# Altium footprint library Miscellaneous THD.PcbLib: 216 footprints (part 5 of 15) (continued)
## HFBR-2602Z [mm] "HFBR-2602Z Series, Fiber Optic Receiver, Through Hole Mount"
height 10.2
pads (8):
  round 1.7 hole 1: 1(-1.27,3.81) 4(-1.27,-3.81) 5(1.27,-3.81) 8(1.27,3.81)
  round 1.4 hole 0.7: 2(-1.27,1.27) 3(-1.27,-1.27) 6(1.27,-1.27) 7(1.27,1.27)
Top Overlay:
  circle w0.3: c-3.81,5.08 r0.15
  lines w0.2: 7.62,-3.2 8.12,-3.2 8.12,3.2 7.62,3.2 ; 8.12,2.7 8.62,3.2 ; 8.62,-3.2 9.12,-2.7 ; 8.62,-3.2 8.12,-2.7 8.62,3.2 ; 8.62,-3.2 9.12,2.7 ; 8.62,3.2 9.12,2.7 ; 9.12,-2.7 9.62,-3.2 ; 9.12,-2.7 9.62,3.2 ; 9.12,2.7 9.62,3.2 ; 9.62,-3.2 10.12,-2.7 ; 9.62,-3.2 10.12,2.7 ; 9.62,3.2 10.12,2.7 ; 10.12,-2.7 10.62,-3.2 ; 10.12,-2.7 10.62,3.2 ; 10.12,2.7 10.62,3.2 ; 10.62,-3.2 11.12,-2.7 ; 10.62,-3.2 11.12,2.7 ; 10.62,3.2 11.12,2.7 ; 11.12,-2.7 11.62,-3.2 ; 11.12,-2.7 11.62,3.2 ; 11.12,2.7 11.62,3.2 ; 11.62,-3.2 12.12,-2.7 ; 11.62,-3.2 12.12,2.7 ; 11.62,3.2 12.12,2.7 ; 12.12,-2.7 12.62,-3.2 ; 12.12,-2.7 12.62,3.2 ; 12.12,2.7 12.62,3.2 ; 12.62,-3.2 13.12,-2.7 ; 12.62,-3.2 13.12,2.7 ; 12.62,3.2 13.12,2.7 ; 13.12,-2.7 13.62,-3.2 ; 13.12,-2.7 13.62,3.2 ; 13.12,2.7 13.62,3.2 ; 13.62,-3.2 14.12,-2.7 ; 13.62,-3.2 14.12,2.7 ; 13.62,3.2 14.12,2.7 ; 14.12,-2.7 14.62,-3.2 ; 14.12,-2.7 14.62,3.2 ; 14.12,2.7 14.62,3.2 ; 14.62,-3.2 15.12,-2.7 ; 14.62,-3.2 15.12,2.7 ; 14.62,3.2 15.12,2.7 ; 15.12,-2.7 15.62,-3.2 ; 15.12,-2.7 15.62,3.2 ; 15.12,2.7 15.62,3.2 ; 15.62,-3.2 16.12,-2.7 ; 15.62,-3.2 16.12,2.7 ; 15.62,3.2 16.12,2.7 ; 16.12,-2.7 16.62,-3.2 ; 16.12,-2.7 16.62,3.2 ; 16.12,2.7 16.62,3.2 ; 16.62,-3.2 17.12,-2.7 17.12,2.7 ; 16.62,-3.2 17.12,2.7 ; 16.62,3.2 17.12,2.7 ; -5.08,-6.15 ccw(c-4.88,-6.15) -4.88,-6.35 7.42,-6.35 ccw(c7.42,-6.15) 7.62,-6.15 7.62,6.15 ccw(c7.42,6.15) 7.42,6.35 -4.88,6.35 ccw(c-4.88,6.15) -5.08,6.15 -5.08,-6.15
Mechanical 8:
  lines w0.1: -2.27,-3.81 -1.27,-3.81 ; -2.27,-1.27 -1.27,-1.27 ; -2.27,1.27 -1.27,1.27 ; -2.27,3.81 -1.27,3.81 ; -1.27,-4.81 -1.27,-3.81 ; -1.27,-2.81 -1.27,-3.81 ; -1.27,-2.27 -1.27,-1.27 ; -1.27,-0.27 -1.27,-1.27 ; -1.27,0.27 -1.27,1.27 ; -1.27,2.27 -1.27,1.27 ; -1.27,2.81 -1.27,3.81 ; -1.27,4.81 -1.27,3.81 ; -1,0 0,0 ; -0.27,-3.81 -1.27,-3.81 ; -0.27,-1.27 -1.27,-1.27 ; -0.27,1.27 -1.27,1.27 ; -0.27,3.81 -1.27,3.81 ; 0,-1 0,0 ; 0,1 0,0 ; 0.27,-3.81 1.27,-3.81 ; 0.27,-1.27 1.27,-1.27 ; 0.27,1.27 1.27,1.27 ; 0.27,3.81 1.27,3.81 ; 1,0 0,0 ; 1.27,-4.81 1.27,-3.81 ; 1.27,-2.81 1.27,-3.81 ; 1.27,-2.27 1.27,-1.27 ; 1.27,-0.27 1.27,-1.27 ; 1.27,0.27 1.27,1.27 ; 1.27,2.27 1.27,1.27 ; 1.27,2.81 1.27,3.81 ; 1.27,4.81 1.27,3.81 ; 2.27,-3.81 1.27,-3.81 ; 2.27,-1.27 1.27,-1.27 ; 2.27,1.27 1.27,1.27 ; 2.27,3.81 1.27,3.81
Mechanical 14:
  circle w0.3: c-3.81,5.08 r0.15
  lines w0.1: 7.62,-3.2 8.12,-3.2 8.12,3.2 7.62,3.2 ; 8.12,2.7 8.62,3.2 ; 8.62,-3.2 9.12,-2.7 ; 8.62,-3.2 8.12,-2.7 8.62,3.2 ; 8.62,-3.2 9.12,2.7 ; 8.62,3.2 9.12,2.7 ; 9.12,-2.7 9.62,-3.2 ; 9.12,-2.7 9.62,3.2 ; 9.12,2.7 9.62,3.2 ; 9.62,-3.2 10.12,-2.7 ; 9.62,-3.2 10.12,2.7 ; 9.62,3.2 10.12,2.7 ; 10.12,-2.7 10.62,-3.2 ; 10.12,-2.7 10.62,3.2 ; 10.12,2.7 10.62,3.2 ; 10.62,-3.2 11.12,-2.7 ; 10.62,-3.2 11.12,2.7 ; 10.62,3.2 11.12,2.7 ; 11.12,-2.7 11.62,-3.2 ; 11.12,-2.7 11.62,3.2 ; 11.12,2.7 11.62,3.2 ; 11.62,-3.2 12.12,-2.7 ; 11.62,-3.2 12.12,2.7 ; 11.62,3.2 12.12,2.7 ; 12.12,-2.7 12.62,-3.2 ; 12.12,-2.7 12.62,3.2 ; 12.12,2.7 12.62,3.2 ; 12.62,-3.2 13.12,-2.7 ; 12.62,-3.2 13.12,2.7 ; 12.62,3.2 13.12,2.7 ; 13.12,-2.7 13.62,-3.2 ; 13.12,-2.7 13.62,3.2 ; 13.12,2.7 13.62,3.2 ; 13.62,-3.2 14.12,-2.7 ; 13.62,-3.2 14.12,2.7 ; 13.62,3.2 14.12,2.7 ; 14.12,-2.7 14.62,-3.2 ; 14.12,-2.7 14.62,3.2 ; 14.12,2.7 14.62,3.2 ; 14.62,-3.2 15.12,-2.7 ; 14.62,-3.2 15.12,2.7 ; 14.62,3.2 15.12,2.7 ; 15.12,-2.7 15.62,-3.2 ; 15.12,-2.7 15.62,3.2 ; 15.12,2.7 15.62,3.2 ; 15.62,-3.2 16.12,-2.7 ; 15.62,-3.2 16.12,2.7 ; 15.62,3.2 16.12,2.7 ; 16.12,-2.7 16.62,-3.2 ; 16.12,-2.7 16.62,3.2 ; 16.12,2.7 16.62,3.2 ; 16.62,-3.2 17.12,-2.7 17.12,2.7 ; 16.62,-3.2 17.12,2.7 ; 16.62,3.2 17.12,2.7 ; -5.08,-6.15 ccw(c-4.88,-6.15) -4.88,-6.35 7.42,-6.35 ccw(c7.42,-6.15) 7.62,-6.15 7.62,6.15 ccw(c7.42,6.15) 7.42,6.35 -4.88,6.35 ccw(c-4.88,6.15) -5.08,6.15 -5.08,-6.15
3D body "HFBR-2602Z.stp": height 10.2, standoff -3.6, extent -5.08,-6.348 17.62,6.348

## HFBR-5911LZ [mm] "Small Form Factor (SFF) Optical Transceiver for Gigabit Ethernet (1.25 GBd) and iSCSI"
height 9.8
pads (18):
  round 1.5 hole 0.8: 1(10.68,5.08) 2(8.9,5.08) 3(7.12,5.08) 4(5.34,5.08) 5(3.56,5.08) 6(3.56,-5.08) 7(5.34,-5.08) 8(7.12,-5.08) 9(8.9,-5.08) 10(10.68,-5.08)
  round 2.1 hole 1.4: CAGE(0,-5.08) CAGE(0,5.08) CAGE(21.36,-6.67) CAGE(23.9,6.67)
  rect 1.8x1 smd paste-0.8: CAGE(1.82,-6.67) CAGE(1.82,6.67)
  round 2.3 hole 1.4: CAGE(28.47,-5.08) CAGE(28.47,5.08)
Top Layer:
  region: 25.47,6.795 25.47,3.795 31.47,3.795 31.47,6.795
  region: 25.47,-3.795 25.47,-6.795 31.47,-6.795 31.47,-3.795
Top Overlay:
  lines w0.2: -0.125,-6.525 -0.125,-6.795 0.52,-6.795 ; -0.125,-3.635 -0.125,3.635 ; -0.125,6.525 -0.125,6.795 0.52,6.795 ; 3.12,-6.795 19.915,-6.795 ; 3.12,6.795 22.455,6.795 ; 22.805,-6.795 25.07,-6.795 ; 31.87,-6.795 48.06,-6.795 48.06,6.795 31.87,6.795 ; 35.675,6.736 35.714,-6.795 ; 36.475,-6.795 36.475,6.795 ; 43.459,-5.7 41.296,-5.7 41.296,-4.7 43.459,-4.7 ; 43.459,-0.5 41.296,-0.5 41.296,0.5 43.459,0.5 ; 43.459,4.7 41.296,4.7 41.296,5.7 43.459,5.7 ; 43.63,-6.795 cw(c42.23,-1.995) 40.83,-6.795 40.774,-6.987 ccw(c42.23,-1.995) 44.23,-6.795 ; 43.63,6.795 ccw(c42.23,1.995) 40.83,6.795 40.774,6.987 cw(c42.23,1.995) 44.23,6.795 ; 45.56,-4.75 48.06,-4.75 ; 45.568,-6.795 45.568,6.795 ; 45.573,-1.35 48.06,-1.35 ; 45.573,1.35 48.06,1.35 ; 45.573,4.75 48.06,4.75 ; 45.925,-4.75 45.925,-5.35 48.06,-5.35 ; 45.925,-1.35 45.925,-0.75 48.06,-0.75 ; 45.925,1.35 45.925,0.75 48.06,0.75 ; 45.925,4.75 45.925,5.35 48.06,5.35 ; 42.377,-2.9 42.377,-2.3 44.377,-2.3 44.377,-2 45.177,-2.6 44.377,-3.2 44.377,-2.9 42.377,-2.9 ; 42.377,2.6 43.177,3.2 43.177,2.9 45.177,2.9 45.177,2.3 43.177,2.3 43.177,2 42.377,2.6
Mechanical 8:
  drawing of 165 lines, arcs and shapes, not listed
Mechanical 14:
  lines w0.1: 35.675,6.736 35.714,-6.795 ; 36.475,-6.795 36.475,6.795 ; 43.459,-5.7 41.296,-5.7 41.296,-4.7 43.459,-4.7 ; 43.459,-0.5 41.296,-0.5 41.296,0.5 43.459,0.5 ; 43.459,4.7 41.296,4.7 41.296,5.7 43.459,5.7 ; 43.63,-6.795 cw(c42.23,-1.995) 40.83,-6.795 40.774,-6.987 ccw(c42.23,-1.995) 44.23,-6.795 ; 43.63,6.795 ccw(c42.23,1.995) 40.83,6.795 40.774,6.987 cw(c42.23,1.995) 44.23,6.795 ; 45.56,-4.75 48.06,-4.75 ; 45.568,-6.795 45.568,6.795 ; 45.573,-1.35 48.06,-1.35 ; 45.573,1.35 48.06,1.35 ; 45.573,4.75 48.06,4.75 ; 45.925,-4.75 45.925,-5.35 48.06,-5.35 ; 45.925,-1.35 45.925,-0.75 48.06,-0.75 ; 45.925,1.35 45.925,0.75 48.06,0.75 ; 45.925,4.75 45.925,5.35 48.06,5.35 ; -0.125,-6.795 -0.125,6.795 48.06,6.795 48.06,-6.795 -0.125,-6.795 ; 42.377,-2.9 42.377,-2.3 44.377,-2.3 44.377,-2 45.177,-2.6 44.377,-3.2 44.377,-2.9 42.377,-2.9 ; 42.377,2.6 43.177,3.2 43.177,2.9 45.177,2.9 45.177,2.3 43.177,2.3 43.177,2 42.377,2.6
3D body "HFBR-5911LZ.stp": height 10.09, standoff -3.2, extent -0.125,-7.187 48.06,7.187

## HFBR-x40x [mm] "HFBR-0400Z Series, Fiber Optic Transmitter or Receiver, Through Hole Mount"
height 10.2
pads (8):
  round 1.7 hole 1: 1(-1.27,3.81) 4(-1.27,-3.81) 5(1.27,-3.81) 8(1.27,3.81)
  round 1.4 hole 0.7: 2(-1.27,1.27) 3(-1.27,-1.27) 6(1.27,-1.27) 7(1.27,1.27)
Top Overlay:
  circle w0.3: c-3.81,5.08 r0.15
  lines w0.2: 7.62,-3.2 8.12,-3.2 8.12,3.2 7.62,3.2 ; 8.12,2.7 8.62,3.2 ; 8.62,-3.2 9.12,-2.7 ; 8.62,-3.2 8.12,-2.7 8.62,3.2 ; 8.62,-3.2 9.12,2.7 ; 8.62,3.2 9.12,2.7 ; 9.12,-2.7 9.62,-3.2 ; 9.12,-2.7 9.62,3.2 ; 9.12,2.7 9.62,3.2 ; 9.62,-3.2 10.12,-2.7 ; 9.62,-3.2 10.12,2.7 ; 9.62,3.2 10.12,2.7 ; 10.12,-2.7 10.62,-3.2 ; 10.12,-2.7 10.62,3.2 ; 10.12,2.7 10.62,3.2 ; 10.62,-3.2 11.12,-2.7 ; 10.62,-3.2 11.12,2.7 ; 10.62,3.2 11.12,2.7 ; 11.12,-2.7 11.62,-3.2 ; 11.12,-2.7 11.62,3.2 ; 11.12,2.7 11.62,3.2 ; 11.62,-3.2 12.12,-2.7 ; 11.62,-3.2 12.12,2.7 ; 11.62,3.2 12.12,2.7 ; 12.12,-2.7 12.62,-3.2 ; 12.12,-2.7 12.62,3.2 ; 12.12,2.7 12.62,3.2 ; 12.62,-3.2 13.12,-2.7 ; 12.62,-3.2 13.12,2.7 ; 12.62,3.2 13.12,2.7 ; 13.12,-2.7 13.62,-3.2 ; 13.12,-2.7 13.62,3.2 ; 13.12,2.7 13.62,3.2 ; 13.62,-3.2 14.12,-2.7 ; 13.62,-3.2 14.12,2.7 ; 13.62,3.2 14.12,2.7 ; 14.12,-2.7 14.62,-3.2 ; 14.12,-2.7 14.62,3.2 ; 14.12,2.7 14.62,3.2 ; 14.62,-3.2 15.12,-2.7 ; 14.62,-3.2 15.12,2.7 ; 14.62,3.2 15.12,2.7 ; 15.12,-2.7 15.62,-3.2 ; 15.12,-2.7 15.62,3.2 ; 15.12,2.7 15.62,3.2 ; 15.62,-3.2 16.12,-2.7 ; 15.62,-3.2 16.12,2.7 ; 15.62,3.2 16.12,2.7 ; 16.12,-2.7 16.62,-3.2 ; 16.12,-2.7 16.62,3.2 ; 16.12,2.7 16.62,3.2 ; 16.62,-3.2 17.12,-2.7 17.12,2.7 ; 16.62,-3.2 17.12,2.7 ; 16.62,3.2 17.12,2.7 ; -5.08,-6.15 ccw(c-4.88,-6.15) -4.88,-6.35 7.42,-6.35 ccw(c7.42,-6.15) 7.62,-6.15 7.62,6.15 ccw(c7.42,6.15) 7.42,6.35 -4.88,6.35 ccw(c-4.88,6.15) -5.08,6.15 -5.08,-6.15
Mechanical 8:
  lines w0.1: -2.27,-3.81 -1.27,-3.81 ; -2.27,-1.27 -1.27,-1.27 ; -2.27,1.27 -1.27,1.27 ; -2.27,3.81 -1.27,3.81 ; -1.27,-4.81 -1.27,-3.81 ; -1.27,-2.81 -1.27,-3.81 ; -1.27,-2.27 -1.27,-1.27 ; -1.27,-0.27 -1.27,-1.27 ; -1.27,0.27 -1.27,1.27 ; -1.27,2.27 -1.27,1.27 ; -1.27,2.81 -1.27,3.81 ; -1.27,4.81 -1.27,3.81 ; -1,0 0,0 ; -0.27,-3.81 -1.27,-3.81 ; -0.27,-1.27 -1.27,-1.27 ; -0.27,1.27 -1.27,1.27 ; -0.27,3.81 -1.27,3.81 ; 0,-1 0,0 ; 0,1 0,0 ; 0.27,-3.81 1.27,-3.81 ; 0.27,-1.27 1.27,-1.27 ; 0.27,1.27 1.27,1.27 ; 0.27,3.81 1.27,3.81 ; 1,0 0,0 ; 1.27,-4.81 1.27,-3.81 ; 1.27,-2.81 1.27,-3.81 ; 1.27,-2.27 1.27,-1.27 ; 1.27,-0.27 1.27,-1.27 ; 1.27,0.27 1.27,1.27 ; 1.27,2.27 1.27,1.27 ; 1.27,2.81 1.27,3.81 ; 1.27,4.81 1.27,3.81 ; 2.27,-3.81 1.27,-3.81 ; 2.27,-1.27 1.27,-1.27 ; 2.27,1.27 1.27,1.27 ; 2.27,3.81 1.27,3.81
Mechanical 14:
  circle w0.3: c-3.81,5.08 r0.15
  lines w0.1: 7.62,-3.2 8.12,-3.2 8.12,3.2 7.62,3.2 ; 8.12,2.7 8.62,3.2 ; 8.62,-3.2 9.12,-2.7 ; 8.62,-3.2 8.12,-2.7 8.62,3.2 ; 8.62,-3.2 9.12,2.7 ; 8.62,3.2 9.12,2.7 ; 9.12,-2.7 9.62,-3.2 ; 9.12,-2.7 9.62,3.2 ; 9.12,2.7 9.62,3.2 ; 9.62,-3.2 10.12,-2.7 ; 9.62,-3.2 10.12,2.7 ; 9.62,3.2 10.12,2.7 ; 10.12,-2.7 10.62,-3.2 ; 10.12,-2.7 10.62,3.2 ; 10.12,2.7 10.62,3.2 ; 10.62,-3.2 11.12,-2.7 ; 10.62,-3.2 11.12,2.7 ; 10.62,3.2 11.12,2.7 ; 11.12,-2.7 11.62,-3.2 ; 11.12,-2.7 11.62,3.2 ; 11.12,2.7 11.62,3.2 ; 11.62,-3.2 12.12,-2.7 ; 11.62,-3.2 12.12,2.7 ; 11.62,3.2 12.12,2.7 ; 12.12,-2.7 12.62,-3.2 ; 12.12,-2.7 12.62,3.2 ; 12.12,2.7 12.62,3.2 ; 12.62,-3.2 13.12,-2.7 ; 12.62,-3.2 13.12,2.7 ; 12.62,3.2 13.12,2.7 ; 13.12,-2.7 13.62,-3.2 ; 13.12,-2.7 13.62,3.2 ; 13.12,2.7 13.62,3.2 ; 13.62,-3.2 14.12,-2.7 ; 13.62,-3.2 14.12,2.7 ; 13.62,3.2 14.12,2.7 ; 14.12,-2.7 14.62,-3.2 ; 14.12,-2.7 14.62,3.2 ; 14.12,2.7 14.62,3.2 ; 14.62,-3.2 15.12,-2.7 ; 14.62,-3.2 15.12,2.7 ; 14.62,3.2 15.12,2.7 ; 15.12,-2.7 15.62,-3.2 ; 15.12,-2.7 15.62,3.2 ; 15.12,2.7 15.62,3.2 ; 15.62,-3.2 16.12,-2.7 ; 15.62,-3.2 16.12,2.7 ; 15.62,3.2 16.12,2.7 ; 16.12,-2.7 16.62,-3.2 ; 16.12,-2.7 16.62,3.2 ; 16.12,2.7 16.62,3.2 ; 16.62,-3.2 17.12,-2.7 17.12,2.7 ; 16.62,-3.2 17.12,2.7 ; 16.62,3.2 17.12,2.7 ; -5.08,-6.15 ccw(c-4.88,-6.15) -4.88,-6.35 7.42,-6.35 ccw(c7.42,-6.15) 7.62,-6.15 7.62,6.15 ccw(c7.42,6.15) 7.42,6.35 -4.88,6.35 ccw(c-4.88,6.15) -5.08,6.15 -5.08,-6.15
3D body "HFBR-x40x.stp": height 10.2, standoff -3.6, extent -5.08,-6.35 17.62,6.35

## HFBR-x41xTMZ [mm] "HFBR-14xxZ, HFBR-14xxZ Series With Threaded ST Port (Metal Option), Fiber Optic Transmitter or Receiver, Through Hole Mount"
height 10.2
pads (8):
  round 1.6 hole 0.9: 1(-1.27,3.81) 4(-1.27,-3.81) 5(1.27,-3.81) 8(1.27,3.81)
  round 1.4 hole 0.7: 2(-1.27,1.27) 3(-1.27,-1.27) 6(1.27,-1.27) 7(1.27,1.27)
Top Overlay:
  circle w0.3: c-3.81,5.08 r0.15
  lines w0.2: 7.62,3.525 22.12,3.525 22.12,-3.525 7.625,-3.525 ; 16.92,-3.525 16.92,-4.2 18.32,-4.2 18.32,-3.525 ; 16.92,3.525 16.92,4.2 18.32,4.2 18.32,3.525 ; 22.12,-0.6 15.92,-0.6 cw(c15.92,0) 15.92,0.6 22.12,0.6 ; -5.08,-6.15 ccw(c-4.88,-6.15) -4.88,-6.35 7.42,-6.35 ccw(c7.42,-6.15) 7.62,-6.15 7.62,6.15 ccw(c7.42,6.15) 7.42,6.35 -4.88,6.35 ccw(c-4.88,6.15) -5.08,6.15 -5.08,-6.15
Mechanical 8:
  lines w0.1: -2.27,-3.81 -1.27,-3.81 ; -2.27,-1.27 -1.27,-1.27 ; -2.27,1.27 -1.27,1.27 ; -2.27,3.81 -1.27,3.81 ; -1.27,-4.81 -1.27,-3.81 ; -1.27,-2.81 -1.27,-3.81 ; -1.27,-2.27 -1.27,-1.27 ; -1.27,-0.27 -1.27,-1.27 ; -1.27,0.27 -1.27,1.27 ; -1.27,2.27 -1.27,1.27 ; -1.27,2.81 -1.27,3.81 ; -1.27,4.81 -1.27,3.81 ; -1,0 0,0 ; -0.27,-3.81 -1.27,-3.81 ; -0.27,-1.27 -1.27,-1.27 ; -0.27,1.27 -1.27,1.27 ; -0.27,3.81 -1.27,3.81 ; 0,-1 0,0 ; 0,1 0,0 ; 0.27,-3.81 1.27,-3.81 ; 0.27,-1.27 1.27,-1.27 ; 0.27,1.27 1.27,1.27 ; 0.27,3.81 1.27,3.81 ; 1,0 0,0 ; 1.27,-4.81 1.27,-3.81 ; 1.27,-2.81 1.27,-3.81 ; 1.27,-2.27 1.27,-1.27 ; 1.27,-0.27 1.27,-1.27 ; 1.27,0.27 1.27,1.27 ; 1.27,2.27 1.27,1.27 ; 1.27,2.81 1.27,3.81 ; 1.27,4.81 1.27,3.81 ; 2.27,-3.81 1.27,-3.81 ; 2.27,-1.27 1.27,-1.27 ; 2.27,1.27 1.27,1.27 ; 2.27,3.81 1.27,3.81
Mechanical 14:
  circle w0.3: c-3.81,5.08 r0.15
  lines w0.1: 7.62,-3.525 22.12,-3.525 22.12,3.525 7.62,3.525 ; 16.92,-3.525 16.92,-4.2 18.32,-4.2 18.32,-3.525 ; 16.92,3.525 16.92,4.2 18.32,4.2 18.32,3.525 ; 22.12,-0.6 15.92,-0.6 cw(c15.92,0) 15.92,0.6 22.12,0.6 ; -5.08,-6.15 ccw(c-4.88,-6.15) -4.88,-6.35 7.42,-6.35 ccw(c7.42,-6.15) 7.62,-6.15 7.62,6.15 ccw(c7.42,6.15) 7.42,6.35 -4.88,6.35 ccw(c-4.88,6.15) -5.08,6.15 -5.08,-6.15
3D body "HFBR-x41xTMZ.stp": height 10.2, standoff -3.6, extent -5.08,-6.35 22.12,6.35

## HFBR-x41xTZ [mm] "HFBR-14xxZ, HFBR-14xxZ Series With Threaded ST Port, Fiber Optic Transmitter or Receiver, Through Hole Mount"
height 10.2
pads (8):
  round 1.6 hole 0.9: 1(-1.27,3.81) 4(-1.27,-3.81) 5(1.27,-3.81) 8(1.27,3.81)
  round 1.4 hole 0.7: 2(-1.27,1.27) 3(-1.27,-1.27) 6(1.27,-1.27) 7(1.27,1.27)
Top Overlay:
  circle w0.3: c-3.81,5.08 r0.15
  lines w0.2: 7.62,-4.25 8.12,-4.75 ; 7.62,4.25 8.12,4.75 ; 12.72,-3.525 22.12,-3.525 22.12,3.525 12.72,3.525 ; 16.92,-3.525 16.92,-4.2 18.32,-4.2 18.32,-3.525 ; 16.92,3.525 16.92,4.2 18.32,4.2 18.32,3.525 ; 22.12,-0.6 15.92,-0.6 cw(c15.92,0) 15.92,0.6 22.12,0.6 ; 8.12,-4.75 8.62,-4.25 ; 8.12,-4.75 8.12,4.75 ; 8.12,4.75 8.62,4.25 ; 8.62,-4.25 9.12,-4.75 ; 8.62,-4.25 8.62,4.25 ; 8.62,4.25 9.12,4.75 ; 9.12,-4.75 9.62,-4.25 ; 9.12,-4.75 9.12,4.75 ; 9.12,4.75 9.62,4.25 ; 9.62,-4.25 10.12,-4.75 ; 9.62,-4.25 9.62,4.25 ; 9.62,4.25 10.12,4.75 ; 10.12,-4.75 10.62,-4.25 ; 10.12,-4.75 10.12,4.75 ; 10.12,4.75 10.62,4.25 ; 10.62,-4.25 11.12,-4.75 ; 10.62,-4.25 10.62,4.25 ; 10.62,4.25 11.12,4.75 ; 11.12,-4.75 11.62,-4.25 ; 11.12,-4.75 11.12,4.75 ; 11.12,4.75 11.62,4.25 ; 11.62,-4.25 12.12,-4.75 ; 11.62,-4.25 11.62,4.25 ; 11.62,4.25 12.12,4.75 ; 12.12,-4.75 12.72,-4.15 12.72,4.15 12.12,4.75 ; 12.12,-4.75 12.12,4.75 ; -5.08,-6.15 ccw(c-4.88,-6.15) -4.88,-6.35 7.42,-6.35 ccw(c7.42,-6.15) 7.62,-6.15 7.62,6.15 ccw(c7.42,6.15) 7.42,6.35 -4.88,6.35 ccw(c-4.88,6.15) -5.08,6.15 -5.08,-6.15
Mechanical 8:
  lines w0.1: -2.27,-3.81 -1.27,-3.81 ; -2.27,-1.27 -1.27,-1.27 ; -2.27,1.27 -1.27,1.27 ; -2.27,3.81 -1.27,3.81 ; -1.27,-4.81 -1.27,-3.81 ; -1.27,-2.81 -1.27,-3.81 ; -1.27,-2.27 -1.27,-1.27 ; -1.27,-0.27 -1.27,-1.27 ; -1.27,0.27 -1.27,1.27 ; -1.27,2.27 -1.27,1.27 ; -1.27,2.81 -1.27,3.81 ; -1.27,4.81 -1.27,3.81 ; -1,0 0,0 ; -0.27,-3.81 -1.27,-3.81 ; -0.27,-1.27 -1.27,-1.27 ; -0.27,1.27 -1.27,1.27 ; -0.27,3.81 -1.27,3.81 ; 0,-1 0,0 ; 0,1 0,0 ; 0.27,-3.81 1.27,-3.81 ; 0.27,-1.27 1.27,-1.27 ; 0.27,1.27 1.27,1.27 ; 0.27,3.81 1.27,3.81 ; 1,0 0,0 ; 1.27,-4.81 1.27,-3.81 ; 1.27,-2.81 1.27,-3.81 ; 1.27,-2.27 1.27,-1.27 ; 1.27,-0.27 1.27,-1.27 ; 1.27,0.27 1.27,1.27 ; 1.27,2.27 1.27,1.27 ; 1.27,2.81 1.27,3.81 ; 1.27,4.81 1.27,3.81 ; 2.27,-3.81 1.27,-3.81 ; 2.27,-1.27 1.27,-1.27 ; 2.27,1.27 1.27,1.27 ; 2.27,3.81 1.27,3.81
Mechanical 14:
  circle w0.3: c-3.81,5.08 r0.15
  lines w0.1: 7.62,-4.25 8.12,-4.75 ; 7.62,4.25 8.12,4.75 ; 12.72,-3.525 22.12,-3.525 22.12,3.525 12.72,3.525 ; 16.92,-3.525 16.92,-4.2 18.32,-4.2 18.32,-3.525 ; 16.92,3.525 16.92,4.2 18.32,4.2 18.32,3.525 ; 22.12,-0.6 15.92,-0.6 cw(c15.92,0) 15.92,0.6 22.12,0.6 ; 8.12,-4.75 8.62,-4.25 ; 8.12,-4.75 8.12,4.75 ; 8.12,4.75 8.62,4.25 ; 8.62,-4.25 9.12,-4.75 ; 8.62,-4.25 8.62,4.25 ; 8.62,4.25 9.12,4.75 ; 9.12,-4.75 9.62,-4.25 ; 9.12,-4.75 9.12,4.75 ; 9.12,4.75 9.62,4.25 ; 9.62,-4.25 10.12,-4.75 ; 9.62,-4.25 9.62,4.25 ; 9.62,4.25 10.12,4.75 ; 10.12,-4.75 10.62,-4.25 ; 10.12,-4.75 10.12,4.75 ; 10.12,4.75 10.62,4.25 ; 10.62,-4.25 11.12,-4.75 ; 10.62,-4.25 10.62,4.25 ; 10.62,4.25 11.12,4.75 ; 11.12,-4.75 11.62,-4.25 ; 11.12,-4.75 11.12,4.75 ; 11.12,4.75 11.62,4.25 ; 11.62,-4.25 12.12,-4.75 ; 11.62,-4.25 11.62,4.25 ; 11.62,4.25 12.12,4.75 ; 12.12,-4.75 12.72,-4.15 12.72,4.15 12.12,4.75 ; 12.12,-4.75 12.12,4.75 ; -5.08,-6.15 ccw(c-4.88,-6.15) -4.88,-6.35 7.42,-6.35 ccw(c7.42,-6.15) 7.62,-6.15 7.62,6.15 ccw(c7.42,6.15) 7.42,6.35 -4.88,6.35 ccw(c-4.88,6.15) -5.08,6.15 -5.08,-6.15
3D body "HFBR-x41xTZ.stp": height 10.2, standoff -3.6, extent -5.08,-6.35 22.12,6.35

## HFBR-x52x [mm] "HFBR-0500Z Series, Fiber Optic Transmitter or Receiver, Through Hole Mount"
height 7.62
pads (6):
  round 1.7 hole 1: 1(-3.81,3.81) 2(-3.81,1.27) 3(-3.81,-1.27) 4(-3.81,-3.81) 5(3.81,3.81) 8(3.81,-3.81)
Top Overlay:
  circle w0.3: c-6.65,3.2 r0.15
  circle w0.2: c11.62,2.6 r0.6
  circle w0.2: c11.62,-2.6 r0.6
  lines w0.2: 2.72,-4.2 2.72,-4.25 1.92,-4.065 1.92,-5.08 5.72,-5.08 11.067,-2.833 cw(c11.62,-2.6) 11.311,-2.086 7.554,-3.129 cw(c7.42,-2.647) 6.923,-2.7 6.923,2.7 cw(c7.42,2.647) 7.554,3.129 11.311,2.086 cw(c11.62,2.6) 11.067,2.833 5.72,5.08 1.92,5.08 1.92,6.095 2.72,5.91 2.72,5.96 ; 2.72,-3.4 2.72,-3.05 1.12,-3.05 1.12,-5.08 -6.58,-5.08 -6.58,-3.88 -5.98,-3.88 -5.98,-0.6 -6.58,-0.6 -6.58,0.6 -5.98,0.6 -5.98,3.88 -6.58,3.88 -6.58,5.08 1.12,5.08 1.12,7.11 2.72,7.11 2.72,6.76
Mechanical 8:
  lines w0.1: -4.31,-3.81 -3.81,-3.81 ; -4.31,-1.27 -3.81,-1.27 ; -4.31,1.27 -3.81,1.27 ; -4.31,3.81 -3.81,3.81 ; -3.81,-4.31 -3.81,-3.81 ; -3.81,-3.31 -3.81,-3.81 ; -3.81,-1.77 -3.81,-1.27 ; -3.81,-0.77 -3.81,-1.27 ; -3.81,0.77 -3.81,1.27 ; -3.81,1.77 -3.81,1.27 ; -3.81,3.31 -3.81,3.81 ; -3.81,4.31 -3.81,3.81 ; -3.31,-3.81 -3.81,-3.81 ; -3.31,-1.27 -3.81,-1.27 ; -3.31,1.27 -3.81,1.27 ; -3.31,3.81 -3.81,3.81 ; -0.5,0 0,0 ; 0,-0.5 0,0 ; 0,0.5 0,0 ; 0.5,0 0,0 ; 3.31,-3.81 3.81,-3.81 ; 3.31,3.81 3.81,3.81 ; 3.81,-4.31 3.81,-3.81 ; 3.81,-3.31 3.81,-3.81 ; 3.81,3.31 3.81,3.81 ; 3.81,4.31 3.81,3.81 ; 4.31,-3.81 3.81,-3.81 ; 4.31,3.81 3.81,3.81
Mechanical 14:
  circle w0.3: c-6.65,3.2 r0.15
  circle w0.1: c11.62,-2.6 r0.6
  circle w0.1: c11.62,2.6 r0.6
  lines w0.1: -6.58,-5.08 1.12,-5.08 1.12,-3.05 2.72,-3.05 2.72,-4.25 1.92,-4.065 1.92,-5.08 5.72,-5.08 11.067,-2.833 cw(c11.62,-2.6) 11.311,-2.086 7.554,-3.129 cw(c7.42,-2.647) 6.923,-2.7 6.923,2.7 cw(c7.42,2.647) 7.554,3.129 11.311,2.086 cw(c11.62,2.6) 11.067,2.833 5.72,5.08 1.92,5.08 1.92,6.095 2.72,5.91 2.72,7.11 1.12,7.11 1.12,5.08 -6.58,5.08 -6.58,3.88 -5.98,3.88 -5.98,0.6 -6.58,0.6 -6.58,-0.6 -5.98,-0.6 -5.98,-3.88 -6.58,-3.88 -6.58,-5.08 ; 3.11,-3.81 ccw(c3.81,-3.81) 4.51,-3.81 4.51,3.81 ccw(c3.81,3.81) 3.11,3.81 3.11,-3.81
3D body "HFBR-x52x.stp": height 7.66, standoff -4, extent -6.58,-5.08 12.22,7.11

## HFBR-x53x [mm] "HFBR-0500Z Series, Vertical Package Fiber Optic Transmitter or Receiver, Through Hole Mount"
height 18.8
pads (7):
  round 1.7 hole 1: 1(-3.81,3.81) 2(-3.81,1.27) 3(-3.81,-1.27) 4(-3.81,-3.81) 5(3.81,-3.81) 8(3.81,3.81)
  round 4.6 hole 2.3: MTG1(0,0)
Top Overlay:
  circle w0.2: c-8.24,0 r1.9
  lines w0.2: -11.73,-3.88 -12.75,-3.88 -12.75,-5.08 -11.73,-5.08 ; -11.73,-3.2 -4.901,-3.2 ; -11.73,-2 -4.825,-2 ; -11.73,2 -4.825,2 ; -11.73,3.2 -4.901,3.2 ; -11.73,3.88 -12.75,3.88 -12.75,5.08 5.54,5.08 5.54,-5.08 -11.73,-5.08 ; -4.75,-5.08 -4.75,-4.634 ; -4.75,-0.446 -4.75,0.446 ; -4.75,4.634 -4.75,7.11 -11.73,7.11 -11.73,-5.08 ; -3.276,-2.4 -1.27,-2.4 ; -3.276,2.4 -1.27,2.4 ; 1.484,-2.4 3.49,-2.4 ; 1.484,2.4 3.49,2.4 ; 3.49,-2.602 3.49,2.602 ; 4.13,-2.602 4.13,2.602
Mechanical 8:
  lines w0.1: -4.31,-3.81 -3.81,-3.81 ; -4.31,-1.27 -3.81,-1.27 ; -4.31,1.27 -3.81,1.27 ; -4.31,3.81 -3.81,3.81 ; -3.81,-4.31 -3.81,-3.81 ; -3.81,-3.31 -3.81,-3.81 ; -3.81,-1.77 -3.81,-1.27 ; -3.81,-0.77 -3.81,-1.27 ; -3.81,0.77 -3.81,1.27 ; -3.81,1.77 -3.81,1.27 ; -3.81,3.31 -3.81,3.81 ; -3.81,4.31 -3.81,3.81 ; -3.31,-3.81 -3.81,-3.81 ; -3.31,-1.27 -3.81,-1.27 ; -3.31,1.27 -3.81,1.27 ; -3.31,3.81 -3.81,3.81 ; -0.5,0 0,0 ; 0,-0.5 0,0 ; 0,0.5 0,0 ; 0.5,0 0,0 ; 3.31,-3.81 3.81,-3.81 ; 3.31,3.81 3.81,3.81 ; 3.81,-4.31 3.81,-3.81 ; 3.81,-3.31 3.81,-3.81 ; 3.81,3.31 3.81,3.81 ; 3.81,4.31 3.81,3.81 ; 4.31,-3.81 3.81,-3.81 ; 4.31,3.81 3.81,3.81
Mechanical 14:
  circle w0.1: c-8.24,0 r1.9
  lines w0.1: -11.73,-3.88 -12.75,-3.88 -12.75,-5.08 -11.73,-5.08 ; -11.73,-3.2 -4.11,-3.2 -4.11,-2 -11.73,-2 ; -11.73,2 -4.11,2 -4.11,3.2 -11.73,3.2 ; -11.73,3.88 -12.75,3.88 -12.75,5.08 5.54,5.08 5.54,-5.08 -11.73,-5.08 ; -4.75,-5.08 -4.75,-3.2 ; -4.75,-2 -4.75,2 ; -4.75,-1.6 3.49,-1.6 ; -4.75,1.6 3.49,1.6 ; -4.75,3.2 -4.75,7.11 -11.73,7.11 -11.73,-5.08 ; -4.11,-2.4 3.49,-2.4 ; -4.11,2.4 3.49,2.4 ; 3.11,3.81 cw(c3.81,3.81) 4.51,3.81 ; 3.49,-3.81 ccw(c3.81,-3.81) 4.13,-3.81 4.13,3.81 ccw(c3.81,3.81) 3.49,3.81 3.49,-3.81
3D body "HFBR-x53x.stp": height 18.8, standoff -4, extent -12.75,-5.08 5.54,7.11

## HFBR-x119TZ [mm] "HFBR-2119TZ And HFBR-1119TZ, Fiber Optic Transmitter or Receiver, Through Hole Mount"
height 9.8
pads (16):
  round 1.5 hole 0.8: 1(-8.89,-3.81) 2(-6.35,-3.81) 3(-3.81,-3.81) 4(-1.27,-3.81) 5(1.27,-3.81) 6(3.81,-3.81) 7(6.35,-3.81) 8(8.89,-3.81) 9(8.89,3.81) 10(6.35,3.81) 11(3.81,3.81) 12(1.27,3.81) 13(-1.27,3.81) 14(-3.81,3.81) 15(-6.35,3.81) 16(-8.89,3.81)
Top Overlay:
  lines w0.2: 11.34,-3.8 11.74,3.8 ; 11.34,3.5 11.74,3.8 ; 11.356,-3.5 11.74,-3.8 ; 23.49,-3.5 23.49,-4.1 24.79,-4.1 24.79,-3.5 ; 23.49,3.5 23.49,4.1 24.79,4.1 24.79,3.5 ; 28.64,-0.6 22.74,-0.6 cw(c22.74,0) 22.74,0.6 28.64,0.6 ; 11.74,-3.8 12.124,3.5 ; 11.74,-3.8 12.156,-3.5 ; 11.74,3.8 12.124,3.5 ; 12.124,3.5 12.54,3.8 ; 12.156,-3.5 12.54,3.8 ; 12.156,-3.5 12.54,-3.8 ; 12.54,-3.8 12.924,3.5 ; 12.54,-3.8 12.956,-3.5 ; 12.54,3.8 12.924,3.5 ; 12.924,3.5 13.34,3.8 ; 12.956,-3.5 13.34,3.8 ; 12.956,-3.5 13.34,-3.8 ; 13.34,-3.8 13.724,3.5 ; 13.34,-3.8 13.756,-3.5 ; 13.34,3.8 13.724,3.5 ; 13.724,3.5 14.14,3.8 ; 13.756,-3.5 14.14,3.8 ; 13.756,-3.5 14.14,-3.8 ; 14.14,-3.8 14.524,3.5 ; 14.14,-3.8 14.556,-3.5 ; 14.14,3.8 14.524,3.5 ; 14.524,3.5 14.94,3.8 ; 14.556,-3.5 14.94,3.8 ; 14.556,-3.5 14.94,-3.8 ; 14.94,-3.8 15.324,3.5 ; 14.94,-3.8 15.356,-3.5 ; 14.94,3.8 15.324,3.5 ; 15.324,3.5 15.74,3.8 ; 15.356,-3.5 15.74,3.8 ; 15.356,-3.5 15.74,-3.8 16.14,-3.5 ; 15.74,3.8 16.14,3.5 ; 16.14,-3.5 28.64,-3.5 28.64,3.5 16.14,3.5 ; 16.14,-3.5 16.14,3.5 ; -12.06,-6.095 11.34,-6.095 11.34,6.095 -12.06,6.095 -12.06,-6.095
Mechanical 8:
  lines w0.1: -9.39,-3.81 -8.89,-3.81 ; -9.39,3.81 -8.89,3.81 ; -8.89,-4.31 -8.89,-3.81 ; -8.89,-3.31 -8.89,-3.81 ; -8.89,3.31 -8.89,3.81 ; -8.89,4.31 -8.89,3.81 ; -8.39,-3.81 -8.89,-3.81 ; -8.39,3.81 -8.89,3.81 ; -6.85,-3.81 -6.35,-3.81 ; -6.85,3.81 -6.35,3.81 ; -6.35,-4.31 -6.35,-3.81 ; -6.35,-3.31 -6.35,-3.81 ; -6.35,3.31 -6.35,3.81 ; -6.35,4.31 -6.35,3.81 ; -5.85,-3.81 -6.35,-3.81 ; -5.85,3.81 -6.35,3.81 ; -4.31,-3.81 -3.81,-3.81 ; -4.31,3.81 -3.81,3.81 ; -3.81,-4.31 -3.81,-3.81 ; -3.81,-3.31 -3.81,-3.81 ; -3.81,3.31 -3.81,3.81 ; -3.81,4.31 -3.81,3.81 ; -3.31,-3.81 -3.81,-3.81 ; -3.31,3.81 -3.81,3.81 ; -1.77,-3.81 -1.27,-3.81 ; -1.77,3.81 -1.27,3.81 ; -1.27,-4.31 -1.27,-3.81 ; -1.27,-3.31 -1.27,-3.81 ; -1.27,3.31 -1.27,3.81 ; -1.27,4.31 -1.27,3.81 ; -0.77,-3.81 -1.27,-3.81 ; -0.77,3.81 -1.27,3.81 ; -0.5,0 0,0 ; 0,-0.5 0,0 ; 0,0.5 0,0 ; 0.5,0 0,0 ; 0.77,-3.81 1.27,-3.81 ; 0.77,3.81 1.27,3.81 ; 1.27,-4.31 1.27,-3.81 ; 1.27,-3.31 1.27,-3.81 ; 1.27,3.31 1.27,3.81 ; 1.27,4.31 1.27,3.81 ; 1.77,-3.81 1.27,-3.81 ; 1.77,3.81 1.27,3.81 ; 3.31,-3.81 3.81,-3.81 ; 3.31,3.81 3.81,3.81 ; 3.81,-4.31 3.81,-3.81 ; 3.81,-3.31 3.81,-3.81 ; 3.81,3.31 3.81,3.81 ; 3.81,4.31 3.81,3.81 ; 4.31,-3.81 3.81,-3.81 ; 4.31,3.81 3.81,3.81 ; 5.85,-3.81 6.35,-3.81 ; 5.85,3.81 6.35,3.81 ; 6.35,-4.31 6.35,-3.81 ; 6.35,-3.31 6.35,-3.81 ; 6.35,3.31 6.35,3.81 ; 6.35,4.31 6.35,3.81 ; 6.85,-3.81 6.35,-3.81 ; 6.85,3.81 6.35,3.81 ; 8.39,-3.81 8.89,-3.81 ; 8.39,3.81 8.89,3.81 ; 8.89,-4.31 8.89,-3.81 ; 8.89,-3.31 8.89,-3.81 ; 8.89,3.31 8.89,3.81 ; 8.89,4.31 8.89,3.81 ; 9.39,-3.81 8.89,-3.81 ; 9.39,3.81 8.89,3.81
Mechanical 14:
  lines w0.1: 11.34,-3.8 11.74,3.8 ; 11.34,3.5 11.74,3.8 ; 11.356,-3.5 11.74,-3.8 ; 23.49,-3.5 23.49,-4.1 24.79,-4.1 24.79,-3.5 ; 23.49,3.5 23.49,4.1 24.79,4.1 24.79,3.5 ; 28.64,-0.6 22.74,-0.6 cw(c22.74,0) 22.74,0.6 28.64,0.6 ; 11.74,-3.8 12.124,3.5 ; 11.74,-3.8 12.156,-3.5 ; 11.74,3.8 12.124,3.5 ; 12.124,3.5 12.54,3.8 ; 12.156,-3.5 12.54,3.8 ; 12.156,-3.5 12.54,-3.8 ; 12.54,-3.8 12.924,3.5 ; 12.54,-3.8 12.956,-3.5 ; 12.54,3.8 12.924,3.5 ; 12.924,3.5 13.34,3.8 ; 12.956,-3.5 13.34,3.8 ; 12.956,-3.5 13.34,-3.8 ; 13.34,-3.8 13.724,3.5 ; 13.34,-3.8 13.756,-3.5 ; 13.34,3.8 13.724,3.5 ; 13.724,3.5 14.14,3.8 ; 13.756,-3.5 14.14,3.8 ; 13.756,-3.5 14.14,-3.8 ; 14.14,-3.8 14.524,3.5 ; 14.14,-3.8 14.556,-3.5 ; 14.14,3.8 14.524,3.5 ; 14.524,3.5 14.94,3.8 ; 14.556,-3.5 14.94,3.8 ; 14.556,-3.5 14.94,-3.8 ; 14.94,-3.8 15.324,3.5 ; 14.94,-3.8 15.356,-3.5 ; 14.94,3.8 15.324,3.5 ; 15.324,3.5 15.74,3.8 ; 15.356,-3.5 15.74,3.8 ; 15.356,-3.5 15.74,-3.8 16.14,-3.5 ; 15.74,3.8 16.14,3.5 ; 16.14,-3.5 28.64,-3.5 28.64,3.5 16.14,3.5 ; 16.14,-3.5 16.14,3.5 ; -12.06,-6.095 11.34,-6.095 11.34,6.095 -12.06,6.095 -12.06,-6.095
3D body "HFBR-x119TZ.stp": height 9.8, standoff -3.2, extent -12.06,-6.095 28.64,6.095

## HFBR-x515xZ [mm] "HFBR-x515xZ Series, Mates with ST connector, Fiber Optic Transmitter"
height 10.2
pads (6):
  round 1.6 hole 0.9: 1(-2.5,3.81) 4(-2.5,-3.81)
  round 1.5 hole 0.8: 5(1.31,-3.81) 6(1.31,-1.27) 7(1.31,1.27) 8(1.31,3.81)
Top Overlay:
  circle w0.3: c-2.51,5.38 r0.15
  lines w0.2: 3.8,-3.525 17.4,-3.525 17.4,3.525 3.8,3.525 ; 12.2,-3.525 12.2,-4.2 13.6,-4.2 13.6,-3.525 ; 12.2,3.525 12.2,4.2 13.6,4.2 13.6,3.525 ; 17.4,-0.6 11.2,-0.6 cw(c11.2,0) 11.2,0.6 17.4,0.6 ; -3.8,-6.05 ccw(c-3.6,-6.05) -3.6,-6.25 3.6,-6.25 ccw(c3.6,-6.05) 3.8,-6.05 3.8,6.05 ccw(c3.6,6.05) 3.6,6.25 -3.6,6.25 ccw(c-3.6,6.05) -3.8,6.05 -3.8,-6.05
Mechanical 8:
  lines w0.1: -3,-3.81 -2.5,-3.81 ; -3,3.81 -2.5,3.81 ; -2.5,-4.31 -2.5,-3.81 ; -2.5,-3.31 -2.5,-3.81 ; -2.5,3.31 -2.5,3.81 ; -2.5,4.31 -2.5,3.81 ; -2,-3.81 -2.5,-3.81 ; -2,3.81 -2.5,3.81 ; -0.5,0 0,0 ; 0,-0.5 0,0 ; 0,0.5 0,0 ; 0.5,0 0,0 ; 0.81,-3.81 1.31,-3.81 ; 0.81,-1.27 1.31,-1.27 ; 0.81,1.27 1.31,1.27 ; 0.81,3.81 1.31,3.81 ; 1.31,-4.31 1.31,-3.81 ; 1.31,-3.31 1.31,-3.81 ; 1.31,-1.77 1.31,-1.27 ; 1.31,-0.77 1.31,-1.27 ; 1.31,0.77 1.31,1.27 ; 1.31,1.77 1.31,1.27 ; 1.31,3.31 1.31,3.81 ; 1.31,4.31 1.31,3.81 ; 1.81,-3.81 1.31,-3.81 ; 1.81,-1.27 1.31,-1.27 ; 1.81,1.27 1.31,1.27 ; 1.81,3.81 1.31,3.81
Mechanical 14:
  circle w0.3: c-2.51,5.38 r0.15
  lines w0.1: -3.8,-6.05 ccw(c-3.6,-6.05) -3.6,-6.25 3.6,-6.25 ccw(c3.6,-6.05) 3.8,-6.05 3.8,6.05 ccw(c3.6,6.05) 3.6,6.25 -3.6,6.25 ccw(c-3.6,6.05) -3.8,6.05 -3.8,-6.05 ; -2.9,-4.25 -2.1,-4.25 -2.1,4.25 -2.9,4.25 -2.9,-4.25 ; -2.8,-3.81 ccw(c-2.5,-3.81) -2.2,-3.81 -2.2,3.81 ccw(c-2.5,3.81) -2.8,3.81 -2.8,-3.81
  lines w0.2: 3.8,-3.525 17.4,-3.525 17.4,3.525 3.8,3.525 ; 12.2,-3.525 12.2,-4.2 13.6,-4.2 13.6,-3.525 ; 12.2,3.525 12.2,4.2 13.6,4.2 13.6,3.525 ; 17.4,-0.6 11.2,-0.6 cw(c11.2,0) 11.2,0.6 17.4,0.6
3D body "HFBR-x515xZ.stp": height 10.2, standoff -2.8, extent -3.8,-6.249 17.4,6.25